# Altium footprint library First Board IMX6.PcbLib: 204 footprints (part 1 of 13)
Each footprint in its own frame and in the unit in brackets; x right, y up, seen from the top. Pads: shape width x height; smd on the part's side, far side on the other; paste and mask are expansions set on the pad; w line width, h text height; cw(c..) or ccw(c..) is an arc to the next point about the centre after c.
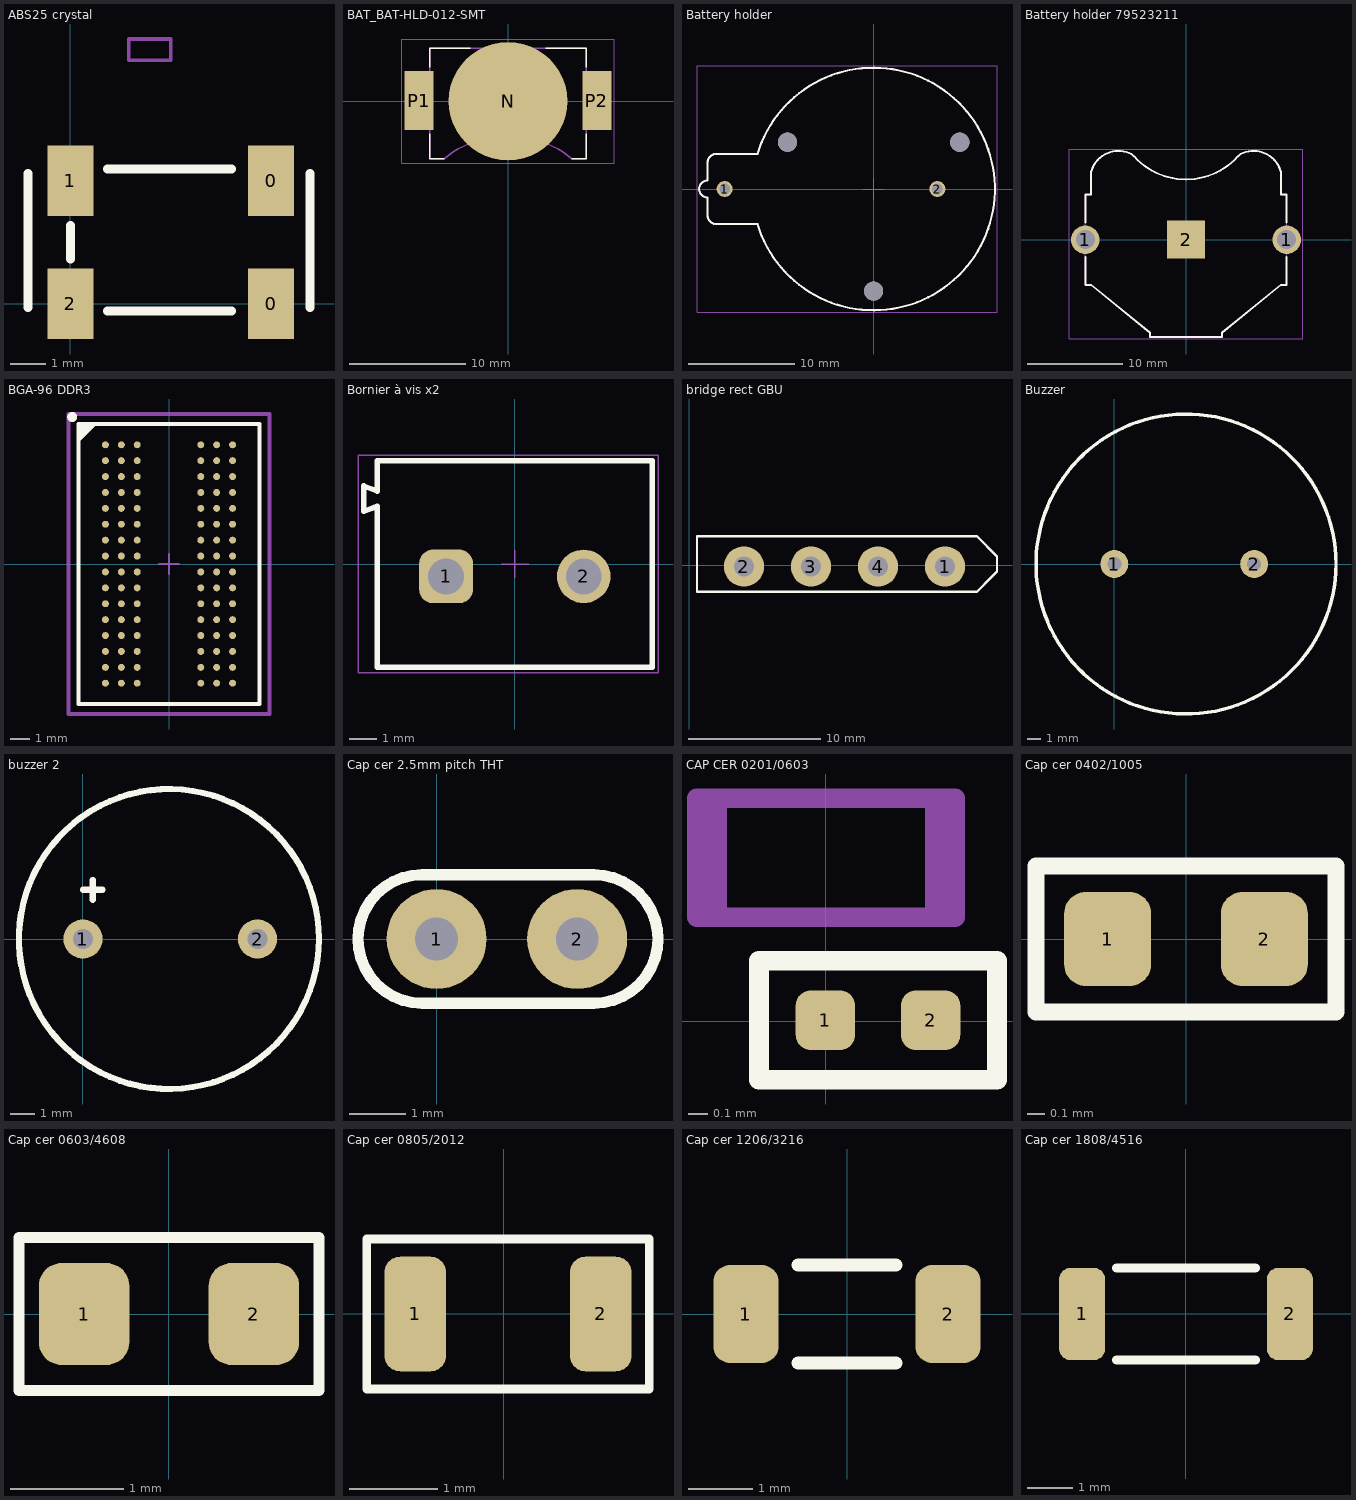
[diagram p0: the footprints below, top view; thin cyan lines are the x and y axes]

## ABS25 crystal [mm]
pads (4):
  rect 1.3x2 smd: 0(5.7,0) 0(5.7,3.5) 1(0,3.5) 2(0,0)
Top Overlay:
  lines w0.254: -1.2,-0.1 -1.2,3.7 ; 0,1.275 0,2.225 ; 1.05,-0.2 4.575,-0.2 ; 1.05,3.825 4.575,3.825 ; 6.8,-0.1 6.8,3.7
Mechanical 30:
  lines w0.1: 1.65,6.923 2.85,6.923 2.85,7.523 1.65,7.523 1.65,6.923
  text ".Designator" at 2.65,7.123 h0.25
3D body "ABS25.step": height 2.6, standoff -0.11, extent -1.2,-0.2 6.8,3.8

## BAT_BAT-HLD-012-SMT [mm]
pads (3):
  round 10.2 smd paste-6: N(0,0)
  rect 2.5x5.1 smd: P1(-7.65,0.05) P2(7.65,0.05)
Top Overlay:
  lines w0.127: -6.75,-2.82 -6.75,-4.95 -5.5,-4.95 ; -6.75,2.92 -6.75,4.55 -3.25,4.55 ; 3.25,4.55 6.75,4.55 6.75,2.92 ; 5.5,-4.95 6.75,-4.95 6.75,-2.82
Mechanical 13:
  lines w0.127: -5.5,-4.95 -6.75,-4.95 -6.75,4.55 6.75,4.55 6.75,-4.95 5.5,-4.95 ; -5.495,-4.946 cw(c0,-11.731) 0,-3 cw(c0,-11.731) 5.495,-4.946
Mechanical 15:
  lines w0.05: -9.15,-5.35 -9.15,5.35 9.15,5.35 9.15,-5.35 -9.15,-5.35
3D body "step_temp.STEP": height 3.56, standoff 0, extent -7.62,-4.699 7.62,4.699

## Battery holder [mm]
pads (5):
  round 1.5 hole 1: 1(-14,0) 2(6,0)
  round 1.8 hole 1.8 unplated: ""(-8.1,4.4) ""(0,-9.6) ""(8.1,4.4)
Top Overlay:
  lines w0.2: -10.912,-3.3 ccw(c-10.912,-3.3) -10.912,-3.3 ; -10.912,-3.3 ccw(c0,0) -10.912,3.3 ; -10.912,-3.3 -14.8,-3.3 cw(c-14.8,-2.5) -15.6,-2.5 -15.6,-0.8 cw(c-15.6,0) -15.6,0.8 -15.6,2.5 cw(c-14.8,2.5) -14.8,3.3 -10.912,3.3 ; -10.912,3.3 ccw(c-10.912,3.3) -10.912,3.3
Mechanical 11:
  lines w0.1: -10.912,-3.3 ccw(c-10.912,-3.3) -10.912,-3.3 ; -10.912,-3.3 ccw(c0,0) -10.912,3.3 ; -10.912,-3.3 -14.8,-3.3 cw(c-14.8,-2.5) -15.6,-2.5 -15.6,-0.8 cw(c-15.6,0) -15.6,0.8 -15.6,2.5 cw(c-14.8,2.5) -14.8,3.3 -10.912,3.3 ; -10.912,3.3 ccw(c-10.912,3.3) -10.912,3.3
  text ".Designator" at -1.75,-0.75 h1.5
Mechanical 13:
  lines w0.1: -10.912,-3.3 ccw(c-10.912,-3.3) -10.912,-3.3 ; -10.912,-3.3 ccw(c0,0) -10.912,3.3 ; -10.912,-3.3 -14.8,-3.3 cw(c-14.8,-2.5) -15.6,-2.5 -15.6,-0.8 cw(c-15.6,0) -15.6,0.8 -15.6,2.5 cw(c-14.8,2.5) -14.8,3.3 -10.912,3.3 ; -10.912,3.3 ccw(c-10.912,3.3) -10.912,3.3
Mechanical 15:
  lines w0.05: -16.6,-11.6 -16.6,11.6 11.6,11.6 11.6,-11.6 -16.6,-11.6
  lines w0.1: -1,0 1,0 ; 0,-1 0,1
3D body "79528211 (rev1).stp": height 8.5, standoff -3.3, extent -16.4,-11.4 11.4,11.4

## Battery holder 79523211 [mm] "Battery Holder, Battery Type: 2016,2020,2025,2032"
height 3.8
pads (3):
  round 3 hole 2: 1(-10.6,0) 1(10.6,0)
  rect 4x4 smd: 2(0,0)
Top Overlay:
  lines w0.2: -10.6,-1.8 -10.6,-4.75 -10,-4.75 -3.81,-9.762 -3.81,-10.25 3.81,-10.25 3.81,-9.762 10,-4.75 10.6,-4.75 10.6,-1.8 ; -10.6,1.8 -10.6,4.75 -10,4.75 -10,7.126 ; -9.998,7.126 cw(c-7.1,6.35) -5.737,9.023 ; -5.709,8.991 ccw(c-4.45,10.15) -5.469,8.775 ; -5.471,8.772 ccw(c0,13.74) 5.471,8.772 ; 5.469,8.775 ccw(c4.45,10.15) 5.709,8.991 ; 5.737,9.023 cw(c7.1,6.35) 9.998,7.126 ; 10,7.126 10,4.75 10.6,4.75 10.6,1.8
Top Solder:
  drawing of 1 lines, arcs and shapes, not listed
Mechanical 2:
  text "open landscape for no solder resist" at -9.75,-11.3 h0.81
Mechanical 11:
  lines w0.1: -10,7.126 -10,4.75 -10.6,4.75 -10.6,-4.75 -10,-4.75 -3.81,-9.762 -3.81,-10.25 3.81,-10.25 3.81,-9.762 10,-4.75 10.6,-4.75 10.6,4.75 10,4.75 10,7.126 ; -9.998,7.126 cw(c-7.1,6.35) -5.737,9.023 ; -5.709,8.991 ccw(c-4.45,10.15) -5.469,8.775 ; -5.471,8.772 ccw(c0,13.74) 5.471,8.772 ; 5.469,8.775 ccw(c4.45,10.15) 5.709,8.991 ; 5.737,9.023 cw(c7.1,6.35) 9.998,7.126
  text ".Designator" at -1.75,-0.75 h1.5
Mechanical 13:
  lines w0.1: -10,7.126 -10,4.75 -10.6,4.75 -10.6,-4.75 -10,-4.75 -3.81,-9.762 -3.81,-10.25 3.81,-10.25 3.81,-9.762 10,-4.75 10.6,-4.75 10.6,4.75 10,4.75 10,7.126 ; -9.998,7.126 cw(c-7.1,6.35) -5.737,9.023 ; -5.709,8.991 ccw(c-4.45,10.15) -5.469,8.775 ; -5.471,8.772 ccw(c0,13.74) 5.471,8.772 ; 5.469,8.775 ccw(c4.45,10.15) 5.709,8.991 ; 5.737,9.023 cw(c7.1,6.35) 9.998,7.126
Mechanical 15:
  lines w0.05: -0.5,0 0.5,0 ; 0,-0.5 0,0.5 ; -12.3,-10.45 -12.3,9.55 12.3,9.55 12.3,-10.45 -12.3,-10.45
3D body "79523211.stp": height 4.02, standoff -2.1, extent -11.299,-10.25 11.299,9.35

## BGA-96 DDR3 [mm]
pads (96):
  round 0.35 smd paste+0 mask+0.05: A1(-3.2,6) A2(-2.4,6) A3(-1.6,6) A7(1.6,6) A8(2.4,6) A9(3.2,6) B1(-3.2,5.2) B2(-2.4,5.2) B3(-1.6,5.2) B7(1.6,5.2) B8(2.4,5.2) B9(3.2,5.2) C1(-3.2,4.4) C2(-2.4,4.4) C3(-1.6,4.4) C7(1.6,4.4) C8(2.4,4.4) C9(3.2,4.4) D1(-3.2,3.6) D2(-2.4,3.6) D3(-1.6,3.6) D7(1.6,3.6) D8(2.4,3.6) D9(3.2,3.6) E1(-3.2,2.8) E2(-2.4,2.8) E3(-1.6,2.8) E7(1.6,2.8) E8(2.4,2.8) E9(3.2,2.8) F1(-3.2,2) F2(-2.4,2) F3(-1.6,2) F7(1.6,2) F8(2.4,2) F9(3.2,2) G1(-3.2,1.2) G2(-2.4,1.2) G3(-1.6,1.2) G7(1.6,1.2) G8(2.4,1.2) G9(3.2,1.2) H1(-3.2,0.4) H2(-2.4,0.4) H3(-1.6,0.4) H7(1.6,0.4) H8(2.4,0.4) H9(3.2,0.4) J1(-3.2,-0.4) J2(-2.4,-0.4) J3(-1.6,-0.4) J7(1.6,-0.4) J8(2.4,-0.4) J9(3.2,-0.4) K1(-3.2,-1.2) K2(-2.4,-1.2) K3(-1.6,-1.2) K7(1.6,-1.2) K8(2.4,-1.2) K9(3.2,-1.2) L1(-3.2,-2) L2(-2.4,-2) L3(-1.6,-2) L7(1.6,-2) L8(2.4,-2) L9(3.2,-2) M1(-3.2,-2.8) M2(-2.4,-2.8) M3(-1.6,-2.8) M7(1.6,-2.8) M8(2.4,-2.8) M9(3.2,-2.8) N1(-3.2,-3.6) N2(-2.4,-3.6) N3(-1.6,-3.6) N7(1.6,-3.6) N8(2.4,-3.6) N9(3.2,-3.6) P1(-3.2,-4.4) P2(-2.4,-4.4) P3(-1.6,-4.4) P7(1.6,-4.4) P8(2.4,-4.4) P9(3.2,-4.4) R1(-3.2,-5.2) R2(-2.4,-5.2) R3(-1.6,-5.2) R7(1.6,-5.2) R8(2.4,-5.2) R9(3.2,-5.2) T1(-3.2,-6) T2(-2.4,-6) T3(-1.6,-6) T7(1.6,-6) T8(2.4,-6) T9(3.2,-6)
Top Overlay:
  circle w0.25: c-4.875,7.4 r0.125
  region: -4.508,7.048 -4.508,6.159 -3.619,7.048
  lines w0.2: -4.55,-7.05 4.55,-7.05 4.55,7.05 -4.55,7.05 -4.55,-7.05
Mechanical 10:
  lines w0.2: -5.05,-7.55 5.05,-7.55 5.05,7.55 -5.05,7.55 -5.05,-7.55
  text ".Designator" at 0,0 h1
Bottom Assembly:
  lines w0.15: -4.55,-7.05 4.55,-7.05 4.55,7.05 -4.55,7.05 -4.55,-7.05
Mechanical 15:
  lines w0.1: -0.5,0 0.5,0 ; 0,-0.5 0,0.5
  lines w0.2: -5.05,-7.55 5.05,-7.55 5.05,7.55 -5.05,7.55 -5.05,-7.55
3D body "IC_Micron_MT41J256M16HA-125-E_eec.STEP": height 0.25, standoff 0, extent -5.05,-7.55 5.05,7.55

## Bornier à vis x2 [mm]
pads (2):
  rrect50% 1.95x1.95 hole 1.3: 1(-2.5,-0.45)
  round 1.95 hole 1.3: 2(2.5,-0.45)
Top Overlay:
  lines w0.2: -5.5,1.913 -5,2.1 -5,-3.75 5,-3.75 5,3.75 -5,3.75 -5,2.65 -5.5,2.837 -5.5,1.913
Mechanical 11:
  lines w0.1: -5.5,1.913 -5.5,2.837 -5,2.65 -5,3.75 5,3.75 5,-3.75 -5,-3.75 -5,2.1 -5.5,1.913
  text ".Designator" at -1.75,-0.75 h1.5
Mechanical 13:
  lines w0.1: -5.5,1.913 -5,2.1 -5,-3.75 5,-3.75 5,3.75 -5,3.75 -5,2.65 -5.5,2.837 -5.5,1.913
Mechanical 15:
  lines w0.05: -0.5,0 0.5,0 ; 0,-0.5 0,0.5 ; -5.7,-3.95 -5.7,3.95 5.2,3.95 5.2,-3.95 -5.7,-3.95
3D body "691502710002.stp": height 10.1, standoff -2.8, extent -5.5,-3.75 5,3.75

## bridge rect GBU [mil]
pads (4):
  round 120 hole 60: 1(763.78,-3.94) 2(163.78,-3.94) 3(363.78,-3.94) 4(563.78,-3.94)
Top Overlay:
  lines w7: 23.78,-78.94 23.78,86.06 858.78,86.06 918.78,26.06 918.78,-18.94 903.78,-33.94 858.78,-78.94 23.78,-78.94
3D body "bridge rectifier GBU.step": height 820.08, standoff -137.8, extent 24.81,-54.05 902.76,86.11

## Buzzer [mil]
pads (2):
  round 80 hole 40: 1(0,0) 2(400,0)
Top Overlay:
  circle w10: c205,0 r428.78
3D body "buzzer murata.step": height 73.43, standoff -347.83, extent -233.07,-433.07 633.08,433.08

## buzzer 2 [mm]
pads (2):
  round 1.6 hole 0.8: 1(0,0) 2(7.1,0)
Top Overlay:
  circle w0.254: c3.5,0 r6.101
  lines w0.254: 0,2 0.8,2 ; 0.4,1.6 0.4,2.4
3D body: height 9, standoff 0, extent -2.5,-6 9.5,6

## Cap cer 2.5mm pitch THT [mil]
pads (2):
  round 70 hole 30: 1(0,0) 2(98.43,0)
Top Overlay:
  lines w7.87: -10,-45 cw(c-10,0) -10,45 110,45 cw(c110,0) 110,-45 -10,-45
3D body "Ceramic Capacitor 5x3_75mm.step": height 125.91, standoff -226.79, extent -46.79,-40 146.79,38.74

## CAP CER 0201/0603 [mm]
pads (2):
  rrect50% 0.3x0.3 smd mask+0.04: 1(-0.003,0.005) 2(0.527,0.005)
Top Overlay:
  lines w0.1: -0.338,-0.295 0.862,-0.295 0.862,0.305 -0.338,0.305 -0.338,-0.295
Mechanical 29:
  lines w0.1: -0.65,0.523 0.55,0.523 0.55,1.123 -0.65,1.123 -0.65,0.523
  text ".Designator" at -0.45,0.723 h0.25
Mechanical 30:
  lines w0.1: -0.55,0.523 0.65,0.523 0.65,1.123 -0.55,1.123 -0.55,0.523
  text ".Designator" at 0.45,0.723 h0.25
3D body "C0201.step": height 0.3, standoff 0, extent -0.04,-0.147 0.56,0.153

## Cap cer 0402/1005 [mil]
pads (2):
  rrect50% 20x21.65 smd mask+2.76: 1(-18,0) 2(18,0)
Top Overlay:
  lines w3.94: -34.45,-16.73 34.45,-16.73 34.45,16.73 -34.45,16.73 -34.45,-16.73
3D body "capacitor 0402.step": height 18.84, standoff -0.84, extent -19.68,-9.84 19.69,9.85

## Cap cer 0603/4608 [mm]
pads (2):
  rrect50% 0.8x0.9 smd: 1(-0.75,0) 2(0.75,0)
Top Overlay:
  lines w0.1: -1.325,-0.675 1.325,-0.675 1.325,0.675 1.225,0.675 -1.325,0.675 -1.325,-0.675
3D body "CAPACITOR 0603.step": height 0.83, standoff 0.03, extent -0.8,-0.4 0.8,0.4

## Cap cer 0805/2012 [mm]
pads (2):
  rrect50% 0.7x1.3 smd: 1(-1,0) 2(1.1,0)
Top Overlay:
  lines w0.1: -1.55,-0.85 1.65,-0.85 1.65,0.85 -1.55,0.85 -1.55,-0.85
3D body "CAPACITOR 0805.step": height 0.63, standoff 0.03, extent -1,-0.615 1,0.635

## Cap cer 1206/3216 [mil]
pads (2):
  rrect50% 40x60 smd: 1(-62,0) 2(62,0)
Top Overlay:
  lines w7.87: -30,-30 30,-30 ; -30,30 30,30
3D body "CAPACITOR 1206.step": height 32.35, standoff 1.65, extent -62.99,-31.49 63,31.5

## Cap cer 1808/4516 [mil]
pads (2):
  rrect50% 40x80 smd: 1(-90,0) 2(90,0)
Top Overlay:
  lines w7.87: -60,-40 60,-40 ; -60,40 60,40
3D body "CAPACITOR 1808.step": height 37.72, standoff 2.28, extent -88.58,-39.36 88.59,39.38